# Altium footprint library 自建库.PcbLib: 169 footprints (part 6 of 11)
Each footprint in its own frame and in the unit in brackets; x right, y up, seen from the top. Pads: shape width x height; smd on the part's side, far side on the other; paste and mask are expansions set on the pad; w line width, h text height; cw(c..) or ccw(c..) is an arc to the next point about the centre after c.
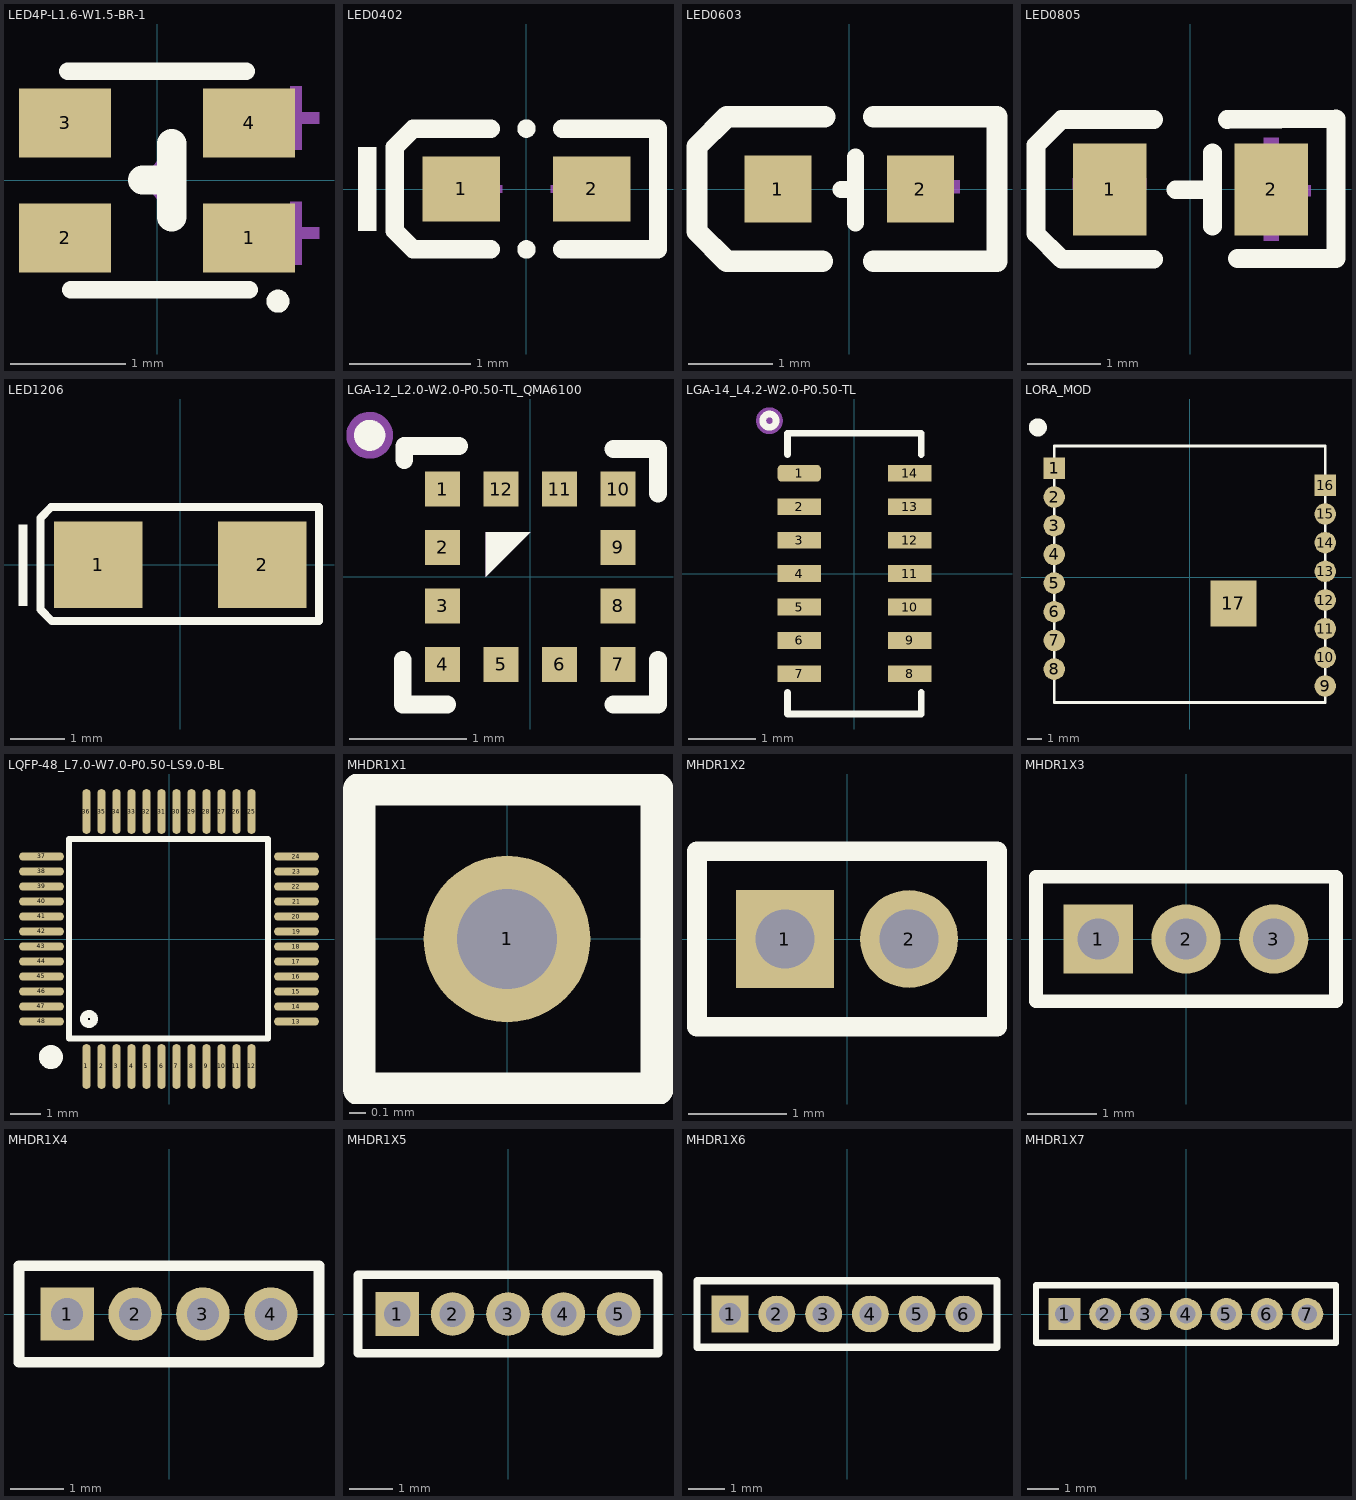
[diagram p5: the footprints below, top view; thin cyan lines are the x and y axes]

## LED4P-L1.6-W1.5-BR-1 [mm]
pads (4):
  rect 0.8x0.6 smd: 1(0.8,-0.5) 2(-0.8,-0.5) 3(-0.8,0.5) 4(0.8,0.5)
Top Overlay:
  circle w0.1: c1.05,-1.05 r0.05
  lines w0.152: -0.775,0.95 0.775,0.95 ; -0.75,-0.95 0.8,-0.95
  lines w0.254: -0.127,0.002 0.127,0.002 ; 0.127,-0.318 0.127,0.317
Mechanical 15:
  region: 1.157,0.816 1.257,0.816 1.257,0.266 1.157,0.266
  region: 1.007,0.591 1.407,0.591 1.407,0.491 1.007,0.491
  region: 1.157,-0.184 1.257,-0.184 1.257,-0.734 1.157,-0.734
  region: 1.007,-0.409 1.407,-0.409 1.407,-0.509 1.007,-0.509
  region: -1.15,0.538 -0.75,0.538 -0.75,0.438 -1.15,0.438
  region: -1.15,-0.462 -0.75,-0.462 -0.75,-0.562 -1.15,-0.562
  region: -0.127,0 0.165,0.383 0.165,-0.379
3D body "LED0606_step.stp": height 0.58, standoff -0.02, extent -0.908,-0.81 0.908,0.81

## LED0402 [mm]
pads (2):
  rect 0.636x0.54 smd: 1(-0.538,0) 2(0.538,0)
Top Overlay:
  circle w0.076: c0,0.499 r0.038
  circle w0.076: c0,-0.499 r0.038
  region: -1.237,-0.346 -1.237,0.346 -1.39,0.346 -1.39,-0.346
  lines w0.152: -0.296,-0.499 -0.933,-0.499 -1.085,-0.346 -1.085,0.346 -0.933,0.499 -0.296,0.499 ; 0.296,-0.499 1.085,-0.499 1.085,0.499 0.296,0.499
Top Paste:
  region: -0.198,-0.23 -0.198,0.23 -0.238,0.27 -0.816,0.27 -0.856,0.23 -0.856,-0.23 -0.816,-0.27 -0.238,-0.27
  region: 0.198,-0.23 0.198,0.23 0.238,0.27 0.816,0.27 0.856,0.23 0.856,-0.23 0.816,-0.27 0.238,-0.27
Mechanical 15:
  region: 0.35,-0.2 0.35,0.2 0.29,0.2 0.29,-0.2
  region: 0.44,-0.03 0.44,0.03 0.2,0.03 0.2,-0.03
  region: -0.44,-0.03 -0.44,0.03 -0.2,0.03 -0.2,-0.03
3D body "LED0402.STEP": height 0.45, standoff 0, extent -0.505,-0.25 0.505,0.25

## LED0603 [mm]
pads (2):
  rect 0.8x0.8 smd: 1(-0.851,0) 2(0.851,0)
Top Overlay:
  lines w0.203: -0.099,-0.008 0.076,-0.008 ; 0.076,-0.406 0.076,0.381
  lines w0.254: -0.318,-0.864 -1.46,-0.864 -1.816,-0.508 -1.816,0.508 -1.46,0.864 -0.292,0.864 ; 0.292,-0.864 1.765,-0.864 1.765,0.864 0.292,0.864
Mechanical 15:
  region: 0.66,0.102 1.321,0.102 1.321,-0.051 0.66,-0.051
  region: 0.936,-0.275 0.936,0.385 1.088,0.385 1.088,-0.275
  region: -1.193,0.05 -0.533,0.05 -0.533,-0.103 -1.193,-0.103
3D body "LED0603.STEP": height 0.6, standoff 0, extent -0.81,-0.4 0.81,0.4

## LED0805 [mm]
pads (2):
  rect 1x1.25 smd: 1(-1.1,0) 2(1.1,0)
Top Overlay:
  lines w0.254: -0.5,-0.95 -1.75,-0.95 ; -0.5,0.95 -1.75,0.95 ; -0.2,-0.005 0.3,-0.005 ; 0.3,-0.5 0.3,0.5 ; 0.5,0.95 1.98,0.96 1.98,-0.94 0.64,-0.94 ; -1.75,-0.95 -1.75,-0.95 ; -1.75,-0.95 -2.1,-0.6 -2.1,0.6 -1.75,0.95 ; -1.75,0.95 -1.75,0.95
Mechanical 15:
  region: 1,0.7 1.2,0.7 1.2,-0.7 1,-0.7
  region: 0.635,-0.094 1.635,-0.094 1.635,0.056 0.635,0.056
  region: -1.6,0 -0.6,0 -0.6,0.15 -1.6,0.15
3D body "LED0805.STEP": height 0.8, standoff 0, extent -1.05,-0.675 1.05,0.675

## LED1206 [mm]
pads (2):
  rect 1.635x1.6 smd: 1(-1.517,0) 2(1.518,0)
Top Overlay:
  region: -2.834,-0.761 -2.834,0.741 -2.986,0.741 -2.986,-0.761
  lines w0.15: -2.59,-0.83 -2.59,0.79 -2.59,0.87 -2.39,1.07 2.57,1.07 2.57,-1.04 -2.38,-1.04 -2.59,-0.83
Top Paste:
  region: -0.7,-0.7 -0.7,-0.329 -0.8,-0.229 -1.156,-0.229 -1.256,-0.129 -1.256,0.129 -1.156,0.229 -0.8,0.229 -0.7,0.329 -0.7,0.7 -0.8,0.8 -2.235,0.8 -2.335,0.7 -2.335,-0.7 -2.235,-0.8 -0.8,-0.8
  region: 0.7,0.7 0.7,0.329 0.8,0.229 1.156,0.229 1.256,0.129 1.256,-0.129 1.156,-0.229 0.8,-0.229 0.7,-0.329 0.7,-0.7 0.8,-0.8 2.235,-0.8 2.335,-0.7 2.335,0.7 2.235,0.8 0.8,0.8
Mechanical 15:
  region: -1.45,-0.075 -1.45,0.075 -0.85,0.075 -0.85,-0.075
  region: 1.45,-0.075 1.45,0.075 0.85,0.075 0.85,-0.075
  region: 1.225,-0.5 1.225,0.5 1.075,0.5 1.075,-0.5
3D body "LED1206.STEP": height 1.1, standoff 0, extent -1.61,-0.8 1.61,0.8

## LGA-12_L2.0-W2.0-P0.50-TL_QMA6100 [mm]
pads (12):
  rect 0.3x0.3 smd paste+0 mask+0.05: 1(-0.75,0.75) 2(-0.75,0.25) 3(-0.75,-0.25) 4(-0.75,-0.75) 5(-0.25,-0.75) 6(0.25,-0.75) 7(0.75,-0.75) 8(0.75,-0.25) 9(0.75,0.25) 10(0.75,0.75) 11(0.25,0.75) 12(-0.25,0.75)
Top Overlay:
  circle w0.152: c-1.375,1.21 r0.057
  region: -0.381,0.381 -0.381,0 0,0.381
  lines w0.152: -1.092,-0.711 -1.092,-1.092 -0.711,-1.092 ; -1.079,0.999 -1.079,1.118 -0.61,1.118 -1.041,1.118 ; 0.711,-1.092 1.092,-1.092 1.092,-0.711 ; 0.711,1.092 1.092,1.092 1.092,0.711
Mechanical 15:
  circle w0.2: c-1.375,1.21 r0.1
  region: 0,0.381 -0.381,0 -0.381,0.381
3D body "lga12.stp": height 0.96, standoff 0, extent -1,-1 1,1

## LGA-14_L4.2-W2.0-P0.50-TL [mm]
pads (14):
  rrect50% 0.65x0.25 smd: 1(-0.825,1.5)
  rect 0.65x0.25 smd: 2(-0.825,1) 3(-0.825,0.5) 4(-0.825,0) 5(-0.825,-0.5) 6(-0.825,-1) 7(-0.825,-1.5) 8(0.825,-1.5) 9(0.825,-1) 10(0.825,-0.5) 11(0.825,0) 12(0.825,0.5) 13(0.825,1) 14(0.825,1.5)
Top Overlay:
  circle w0.1: c-1.27,2.286 r0.1
  lines w0.1: -1,-1.779 -1,-2.1 1,-2.1 1,-1.779 ; -1,1.779 -1,2.1 1,2.1 1,1.779
Mechanical 15:
  circle w0.2: c-1.27,2.286 r0.1
3D body: height 2, standoff 0, extent -1,-2.1 1,2.1

## LORA_MOD [mm] "Lora模块"
pads (17):
  rect 1.5x1.5 smd: 1(-9.45,7.59) 16(9.45,6.41)
  round 1.5 smd: 2(-9.45,5.59) 3(-9.45,3.59) 4(-9.45,1.59) 5(-9.45,-0.41) 6(-9.45,-2.41) 7(-9.45,-4.41) 8(-9.45,-6.41) 9(9.45,-7.59) 10(9.45,-5.59) 11(9.45,-3.59) 12(9.45,-1.59) 13(9.45,0.41) 14(9.45,2.41) 15(9.45,4.41)
  rect 3.2x3.2 smd: 17(3.05,-1.83)
Top Overlay:
  circle w1: c-10.593,10.447 r0.127
  lines w0.2: -9.45,-8.73 9.45,-8.73 9.45,9.15 -9.45,9.15 -9.45,-8.73

## LQFP-48_L7.0-W7.0-P0.50-LS9.0-BL [mm]
pads (48):
  oval 0.27x1.5 smd: 1(-2.75,-4.25) 2(-2.25,-4.25) 3(-1.75,-4.25) 4(-1.25,-4.25) 5(-0.75,-4.25) 6(-0.25,-4.25) 7(0.25,-4.25) 8(0.75,-4.25) 9(1.25,-4.25) 10(1.75,-4.25) 11(2.25,-4.25) 12(2.75,-4.25) 25(2.75,4.25) 26(2.25,4.25) 27(1.75,4.25) 28(1.25,4.25) 29(0.75,4.25) 30(0.25,4.25) 31(-0.25,4.25) 32(-0.75,4.25) 33(-1.25,4.25) 34(-1.75,4.25) 35(-2.25,4.25) 36(-2.75,4.25)
  oval 1.5x0.27 smd: 13(4.25,-2.75) 14(4.25,-2.25) 15(4.25,-1.75) 16(4.25,-1.25) 17(4.25,-0.75) 18(4.25,-0.25) 19(4.25,0.25) 20(4.25,0.75) 21(4.25,1.25) 22(4.25,1.75) 23(4.25,2.25) 24(4.25,2.75) 37(-4.25,2.75) 38(-4.25,2.25) 39(-4.25,1.75) 40(-4.25,1.25) 41(-4.25,0.75) 42(-4.25,0.25) 43(-4.25,-0.25) 44(-4.25,-0.75) 45(-4.25,-1.25) 46(-4.25,-1.75) 47(-4.25,-2.25) 48(-4.25,-2.75)
Top Overlay:
  circle w0.254: c-2.667,-2.667 r0.17
  lines w0.2: -2.896,3.34 3.302,3.34 3.302,-3.315 -3.327,-3.315 -3.327,3.34 -2.565,3.34
  lines w0.4: -3.938,-3.737 ccw(c-3.937,-3.937) -3.936,-3.737
Mechanical 15:
  circle w0.3: c-3.937,-3.937 r0.15
3D body "LQFP48-7x7-0_50.STEP": height 1.45, standoff 0, extent -4.5,-4.5 4.5,4.5

## MHDR1X1 [mm] "Connector; Header; 2 Position"
pads (1):
  round 1 hole 0.6: 1(0,0)
Top Overlay:
  lines w0.2: -0.889,-0.9 -0.889,0.9 0.9,0.9 0.9,-0.9 -0.889,-0.9

## MHDR1X2 [mm] "Connector; Header; 2 Position"
pads (2):
  rect 1x1 hole 0.6: 1(-0.635,0)
  round 1 hole 0.6: 2(0.635,0)
Top Overlay:
  lines w0.2: -1.535,-0.9 -1.535,0.9 1.535,0.9 1.535,-0.9 -1.535,-0.9

## MHDR1X3 [mm] "Connector; Header; 3 Position"
pads (3):
  rect 1x1 hole 0.6: 1(-1.27,0)
  round 1 hole 0.6: 2(0,0) 3(1.27,0)
Top Overlay:
  lines w0.2: -2.17,-0.9 -2.17,0.9 2.17,0.9 2.17,-0.9 -2.17,-0.9

## MHDR1X4 [mm] "Connector; Header; 4 Position"
pads (4):
  rect 1x1 hole 0.6: 1(-1.905,0)
  round 1 hole 0.6: 2(-0.635,0) 3(0.635,0) 4(1.905,0)
Top Overlay:
  lines w0.2: -2.805,-0.9 -2.805,0.9 2.805,0.9 2.805,-0.9 -2.805,-0.9

## MHDR1X5 [mm] "Connector; Header; 5 Position"
pads (5):
  rect 1x1 hole 0.6: 1(-2.54,0)
  round 1 hole 0.6: 2(-1.27,0) 3(0,0) 4(1.27,0) 5(2.54,0)
Top Overlay:
  lines w0.2: -3.44,-0.9 3.44,-0.9 3.44,0.9 -3.44,0.9 -3.44,-0.9

## MHDR1X6 [mm] "Connector; Header; 6 Position"
pads (6):
  rect 1x1 hole 0.6: 1(-3.175,0)
  round 1 hole 0.6: 2(-1.905,0) 3(-0.635,0) 4(0.635,0) 5(1.905,0) 6(3.175,0)
Top Overlay:
  lines w0.2: -4.075,-0.9 4.075,-0.9 4.075,0.9 -4.075,0.9 -4.075,-0.9

## MHDR1X7 [mm] "Connector; Header; 7 Position"
pads (7):
  rect 1x1 hole 0.6: 1(-3.81,0)
  round 1 hole 0.6: 2(-2.54,0) 3(-1.27,0) 4(0,0) 5(1.27,0) 6(2.54,0) 7(3.81,0)
Top Overlay:
  lines w0.2: -4.71,-0.9 4.71,-0.9 4.71,0.9 -4.71,0.9 -4.71,-0.9